# Altium footprint library 6-Connectors-1.PcbLib: 54 footprints (part 2 of 5)
Each footprint in its own frame and in the unit in brackets; x right, y up, seen from the top. Pads: shape width x height; smd on the part's side, far side on the other; paste and mask are expansions set on the pad; w line width, h text height; cw(c..) or ccw(c..) is an arc to the next point about the centre after c.
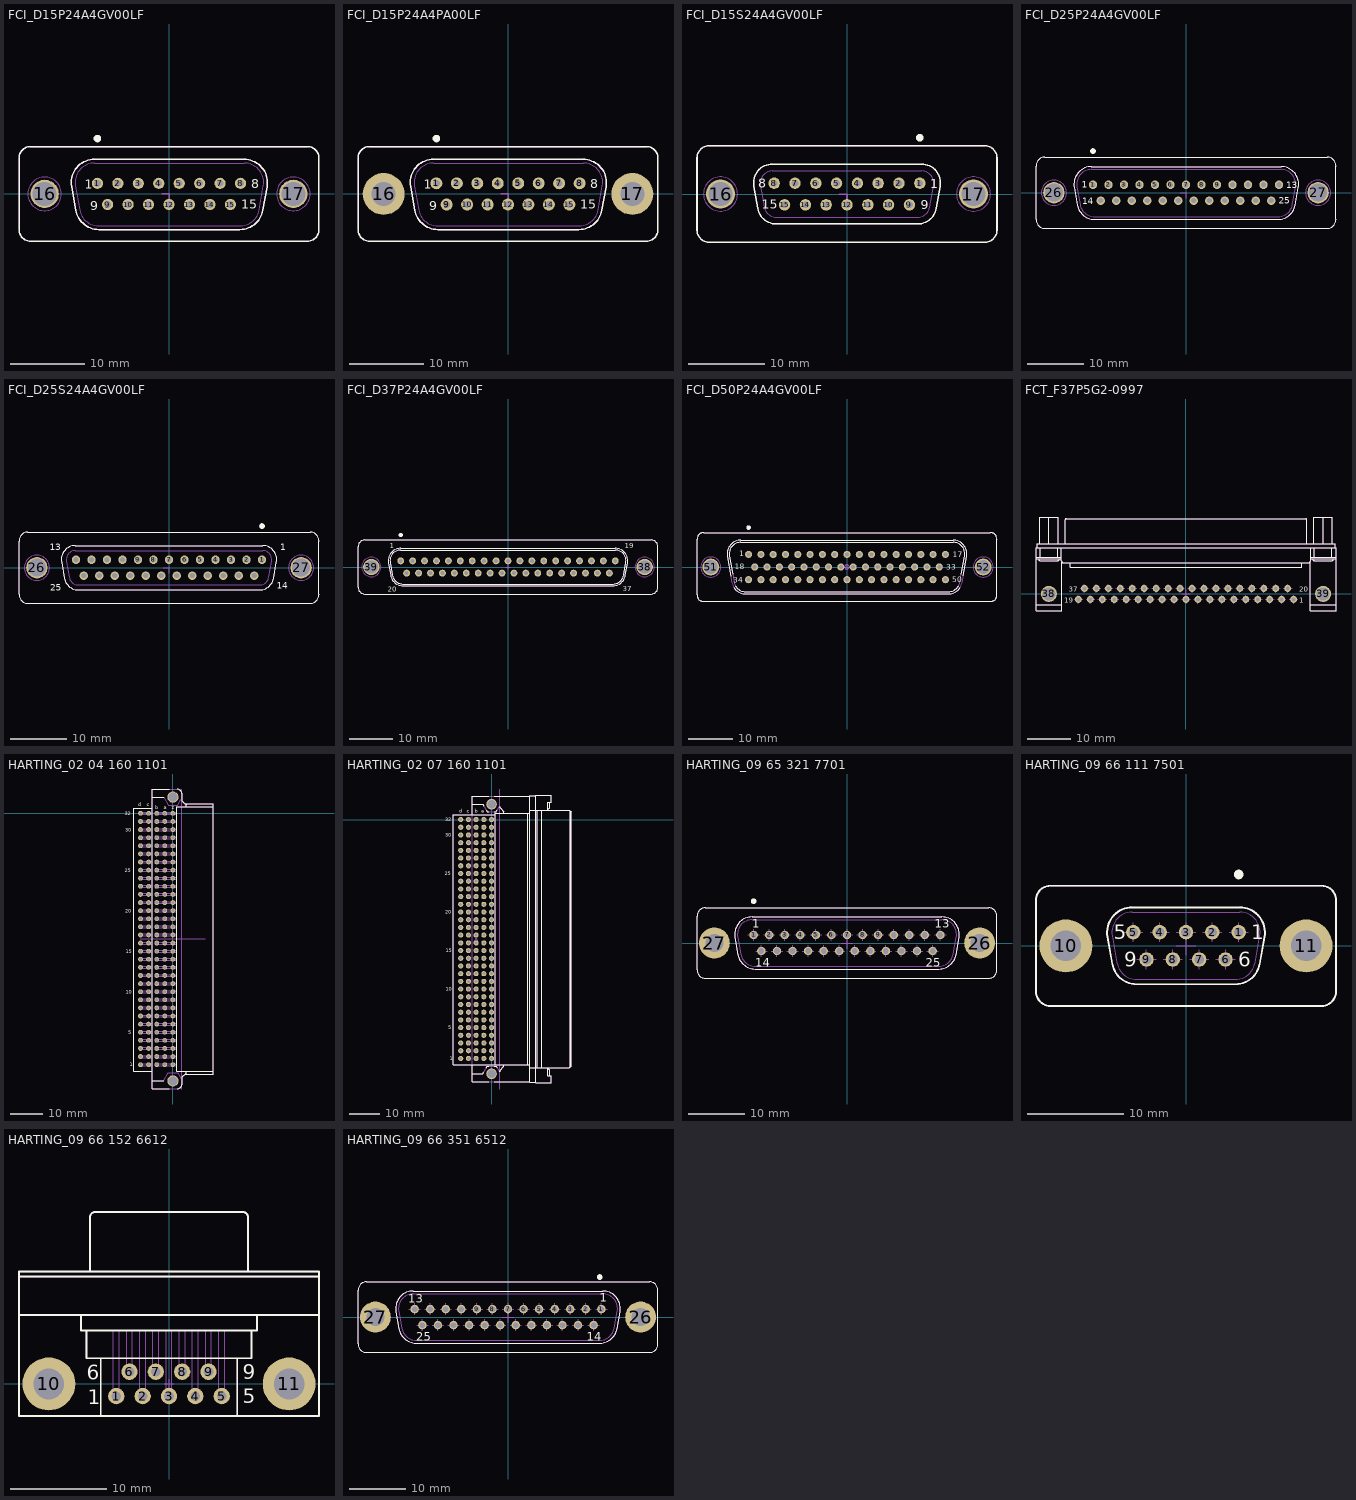
[diagram p1: the footprints below, top view; thin cyan lines are the x and y axes]

## FCI_D15P24A4GV00LF [mm] "Straight D-SUB 15 Male Contacts for PCB  with Harpoons and Female Screwlock (UNC4-40) and Elec. Continuity"
height 12.25
pads (17):
  round 1.5 hole 0.9: 1(-9.59,1.42) 2(-6.85,1.42) 3(-4.11,1.42) 4(-1.37,1.42) 5(1.37,1.42) 6(4.11,1.42) 7(6.85,1.42) 8(9.59,1.42) 9(-8.22,-1.42) 10(-5.48,-1.42) 11(-2.74,-1.42) 12(0,-1.42) 13(2.74,-1.42) 14(5.48,-1.42) 15(8.22,-1.42)
  round 3.8 hole 3.2: 16(-16.66,0) 17(16.66,0)
Top Overlay:
  circle w0.5: c-9.59,7.42 r0.25
  lines w0.2: -20.095,-4.75 ccw(c-18.495,-4.75) -18.495,-6.35 18.495,-6.35 ccw(c18.495,-4.75) 20.095,-4.75 20.095,4.75 ccw(c18.495,4.75) 18.495,6.35 -18.495,6.35 ccw(c-18.495,4.75) -20.095,4.75 -20.095,-4.75 ; -13.038,0.978 cw(c-9.965,1.52) -9.965,4.64 10.065,4.64 cw(c10.065,1.52) 13.138,0.978 12.579,-2.192 cw(c9.506,-1.65) 9.506,-4.77 -9.406,-4.77 cw(c-9.406,-1.65) -12.479,-2.192 -13.038,0.978
  text "15" at 9.695,-1.995 h1.2
  text "1" at -11.29,0.67 h1.2
  text "9" at -10.52,-2.17 h1.2
  text "8" at 11.04,0.77 h1.2
Mechanical 8:
  lines w0.2: -1,0 0,0 0,-1
Mechanical 14:
  circle w0.1: c16.66,0 r2.25
  circle w0.1: c-16.66,0 r2.25
  lines w0.1: -20.095,-4.75 ccw(c-18.495,-4.75) -18.495,-6.35 18.495,-6.35 ccw(c18.495,-4.75) 20.095,-4.75 20.095,4.75 ccw(c18.495,4.75) 18.495,6.35 -18.495,6.35 ccw(c-18.495,4.75) -20.095,4.75 -20.095,-4.75 ; -13.038,0.978 cw(c-9.965,1.52) -9.965,4.64 10.065,4.64 cw(c10.065,1.52) 13.138,0.978 12.579,-2.192 cw(c9.506,-1.65) 9.506,-4.77 -9.406,-4.77 cw(c-9.406,-1.65) -12.479,-2.192 -13.038,0.978 ; -12.545,1.065 cw(c-9.965,1.52) -9.965,4.14 10.065,4.14 cw(c10.065,1.52) 12.645,1.065 12.086,-2.105 cw(c9.506,-1.65) 9.506,-4.27 -9.406,-4.27 cw(c-9.406,-1.65) -11.986,-2.105 -12.545,1.065
  text "8" at 11.04,0.77 h1.2
  text "9" at -10.52,-2.17 h1.2
  text "1" at -11.29,0.67 h1.2
  text "15" at 9.695,-1.995 h1.2
  text "15 D-Sub Male" at -6.028,4.847 h1.2
3D body "FCI_D15P24A4GV00LF.stp": height 12, standoff -3, extent -19.66,-6.275 19.66,6.275

## FCI_D15P24A4PA00LF [mm] "Straight D-SUB 15 Male Contacts for PCB  without Harpoons and without Female Screwlock"
height 12.25
pads (17):
  round 1.6 hole 0.9: 1(-9.59,1.42) 2(-6.85,1.42) 3(-4.11,1.42) 4(-1.37,1.42) 5(1.37,1.42) 6(4.11,1.42) 7(6.85,1.42) 8(9.59,1.42) 9(-8.22,-1.42) 10(-5.48,-1.42) 11(-2.74,-1.42) 12(0,-1.42) 13(2.74,-1.42) 14(5.48,-1.42) 15(8.22,-1.42)
  round 5.6 hole 3.2: 16(-16.66,0) 17(16.66,0)
Top Overlay:
  circle w0.5: c-9.59,7.42 r0.25
  lines w0.2: -20.095,-4.75 ccw(c-18.495,-4.75) -18.495,-6.35 18.495,-6.35 ccw(c18.495,-4.75) 20.095,-4.75 20.095,4.75 ccw(c18.495,4.75) 18.495,6.35 -18.495,6.35 ccw(c-18.495,4.75) -20.095,4.75 -20.095,-4.75 ; -13.038,0.978 cw(c-9.965,1.52) -9.965,4.64 10.065,4.64 cw(c10.065,1.52) 13.138,0.978 12.579,-2.192 cw(c9.506,-1.65) 9.506,-4.77 -9.406,-4.77 cw(c-9.406,-1.65) -12.479,-2.192 -13.038,0.978
  text "8" at 11.04,0.77 h1.2
  text "9" at -10.52,-2.17 h1.2
  text "1" at -11.29,0.67 h1.2
  text "15" at 9.695,-1.995 h1.2
Mechanical 8:
  lines w0.2: -1,0 0,0 0,-1
Mechanical 14:
  circle w0.1: c-16.66,0 r2.25
  circle w0.1: c16.66,0 r2.25
  lines w0.1: -20.095,-4.75 ccw(c-18.495,-4.75) -18.495,-6.35 18.495,-6.35 ccw(c18.495,-4.75) 20.095,-4.75 20.095,4.75 ccw(c18.495,4.75) 18.495,6.35 -18.495,6.35 ccw(c-18.495,4.75) -20.095,4.75 -20.095,-4.75 ; -13.038,0.978 cw(c-9.965,1.52) -9.965,4.64 10.065,4.64 cw(c10.065,1.52) 13.138,0.978 12.579,-2.192 cw(c9.506,-1.65) 9.506,-4.77 -9.406,-4.77 cw(c-9.406,-1.65) -12.479,-2.192 -13.038,0.978 ; -12.545,1.065 cw(c-9.965,1.52) -9.965,4.14 10.065,4.14 cw(c10.065,1.52) 12.645,1.065 12.086,-2.105 cw(c9.506,-1.65) 9.506,-4.27 -9.406,-4.27 cw(c-9.406,-1.65) -11.986,-2.105 -12.545,1.065
  text "15 D-Sub Male" at -6.028,4.847 h1.2
  text "15" at 9.695,-1.995 h1.2
  text "1" at -11.29,0.67 h1.2
  text "9" at -10.52,-2.17 h1.2
  text "8" at 11.04,0.77 h1.2
3D body "FCI_D15P24A4PA00LF.stp": height 11.9, standoff -2, extent -19.66,-6.275 19.66,6.275

## FCI_D15S24A4GV00LF [mm] "Straight D-SUB 15 Female Contacts for PCB  with Harpoons and Female Screwlock (UNC4-40) and Elec. Continuity"
height 12.39
pads (17):
  round 1.5 hole 0.9: 1(9.59,1.42) 2(6.85,1.42) 3(4.11,1.42) 4(1.37,1.42) 5(-1.37,1.42) 6(-4.11,1.42) 7(-6.85,1.42) 8(-9.59,1.42) 9(8.22,-1.42) 10(5.48,-1.42) 11(2.74,-1.42) 12(0,-1.42) 13(-2.74,-1.42) 14(-5.48,-1.42) 15(-8.22,-1.42)
  round 3.8 hole 3.2: 16(-16.66,0) 17(16.66,0)
Top Overlay:
  circle w0.5: c9.59,7.42 r0.25
  lines w0.2: -19.76,-4.75 ccw(c-18.16,-4.75) -18.16,-6.35 18.16,-6.35 ccw(c18.16,-4.75) 19.76,-4.75 19.76,4.75 ccw(c18.16,4.75) 18.16,6.35 -18.16,6.35 ccw(c-18.16,4.75) -19.76,4.75 -19.76,-4.75 ; -12.277,1.011 cw(c-9.815,1.445) -9.815,3.945 9.815,3.945 cw(c9.815,1.445) 12.277,1.011 11.767,-1.879 cw(c9.305,-1.445) 9.305,-3.945 -9.305,-3.945 cw(c-9.305,-1.445) -11.767,-1.879 -12.277,1.011
  text "15" at -11.22,-1.945 h1.2
  text "8" at -11.69,0.82 h1.2
  text "1" at 10.965,0.77 h1.2
  text "9" at 9.695,-1.995 h1.2
Mechanical 8:
  lines w0.2: -1,0 0,0 0,-1
Mechanical 14:
  circle w0.1: c-16.66,0 r2.25
  circle w0.1: c16.66,0 r2.25
  lines w0.1: -19.76,-4.75 ccw(c-18.16,-4.75) -18.16,-6.35 18.16,-6.35 ccw(c18.16,-4.75) 19.76,-4.75 19.76,4.75 ccw(c18.16,4.75) 18.16,6.35 -18.16,6.35 ccw(c-18.16,4.75) -19.76,4.75 -19.76,-4.75 ; -12.277,1.011 cw(c-9.815,1.445) -9.815,3.945 9.815,3.945 cw(c9.815,1.445) 12.277,1.011 11.767,-1.879 cw(c9.305,-1.445) 9.305,-3.945 -9.305,-3.945 cw(c-9.305,-1.445) -11.767,-1.879 -12.277,1.011 ; -11.401,1.167 cw(c-9.825,1.445) -9.825,3.045 9.825,3.045 cw(c9.825,1.445) 11.401,1.167 10.891,-1.723 cw(c9.315,-1.445) 9.315,-3.045 -9.315,-3.045 cw(c-9.315,-1.445) -10.891,-1.723 -11.401,1.167
  text "15 D-Sub Female" at -6.278,4.522 h1.2
  text "9" at 12.845,-2.07 h1.2
  text "1" at 12.99,1.095 h1.2
  text "8" at -13.715,0.945 h1.2
  text "15" at -14.17,-2.045 h1.2
3D body "FCI_D15S24A4GV00LF.stp": height 12.1, standoff -3, extent -19.66,-6.275 19.66,6.275

## FCI_D25P24A4GV00LF [mm] "Straight D-SUB 25 Male Contacts for PCB  with Harpoons and Female Screwlock (UNC4-40) and Elec. Continuity"
height 12.05
pads (27):
  round 1.5 hole 0.9: 1(-16.56,1.42) 2(-13.8,1.42) 3(-11.04,1.42) 4(-8.28,1.42) 5(-5.52,1.42) 6(-2.76,1.42) 7(0,1.42) 8(2.76,1.42) 9(5.52,1.42) 10(8.28,1.42) 11(11.04,1.42) 12(13.8,1.42) 13(16.56,1.42) 14(-15.18,-1.42) 15(-12.42,-1.42) 16(-9.66,-1.42) 17(-6.9,-1.42) 18(-4.14,-1.42) 19(-1.38,-1.42) 20(1.38,-1.42) 21(4.14,-1.42) 22(6.9,-1.42) 23(9.66,-1.42) 24(12.42,-1.42) 25(15.18,-1.42)
  round 3.8 hole 3.2: 26(-23.52,0) 27(23.52,0)
Top Overlay:
  circle w0.5: c-16.56,7.42 r0.25
  lines w0.2: -26.705,-4.75 ccw(c-25.105,-4.75) -25.105,-6.35 25.105,-6.35 ccw(c25.105,-4.75) 26.705,-4.75 26.705,4.75 ccw(c25.105,4.75) 25.105,6.35 -25.105,6.35 ccw(c-25.105,4.75) -26.705,4.75 -26.705,-4.75 ; -19.903,0.978 cw(c-16.83,1.52) -16.83,4.64 16.93,4.64 cw(c16.93,1.52) 20.003,0.978 19.444,-2.192 cw(c16.371,-1.65) 16.371,-4.77 -16.271,-4.77 cw(c-16.271,-1.65) -19.344,-2.192 -19.903,0.978
  text "25" at 16.55,-1.925 h1.2
  text "1" at -18.575,0.85 h1.2
  text "13" at 17.825,0.825 h1.2
  text "14" at -18.475,-2.05 h1.2
Mechanical 8:
  lines w0.2: -1,0 0,0 0,-1
Mechanical 14:
  circle w0.1: c23.52,0 r2.25
  circle w0.1: c-23.52,0 r2.25
  lines w0.1: -26.705,-4.75 ccw(c-25.105,-4.75) -25.105,-6.35 25.105,-6.35 ccw(c25.105,-4.75) 26.705,-4.75 26.705,4.75 ccw(c25.105,4.75) 25.105,6.35 -25.105,6.35 ccw(c-25.105,4.75) -26.705,4.75 -26.705,-4.75 ; -19.903,0.978 cw(c-16.83,1.52) -16.83,4.64 16.93,4.64 cw(c16.93,1.52) 20.003,0.978 19.444,-2.192 cw(c16.371,-1.65) 16.371,-4.77 -16.271,-4.77 cw(c-16.271,-1.65) -19.344,-2.192 -19.903,0.978 ; -19.41,1.065 cw(c-16.83,1.52) -16.83,4.14 16.93,4.14 cw(c16.93,1.52) 19.51,1.065 18.951,-2.105 cw(c16.371,-1.65) 16.371,-4.27 -16.271,-4.27 cw(c-16.271,-1.65) -18.851,-2.105 -19.41,1.065
  text "25 D-Sub Male" at -6.478,4.872 h1.2
  text "14" at -18.475,-2.05 h1.2
  text "13" at 17.5,0.875 h1.2
  text "1" at -18.575,0.85 h1.2
  text "25" at 16.55,-1.925 h1.2
3D body "FCI_D25P24A4GV00LF.stp": height 12, standoff -3, extent -26.52,-6.275 26.52,6.275

## FCI_D25S24A4GV00LF [mm] "Straight D-SUB 25 Female Contacts for PCB  with Harpoons and Female Screwlock (UNC4-40) and Elec. Continuity"
height 12.39
pads (27):
  round 1.5 hole 0.9: 1(16.56,1.42) 2(13.8,1.42) 3(11.04,1.42) 4(8.28,1.42) 5(5.52,1.42) 6(2.76,1.42) 7(0,1.42) 8(-2.76,1.42) 9(-5.52,1.42) 10(-8.28,1.42) 11(-11.04,1.42) 12(-13.8,1.42) 13(-16.56,1.42) 14(15.18,-1.42) 15(12.42,-1.42) 16(9.66,-1.42) 17(6.9,-1.42) 18(4.14,-1.42) 19(1.38,-1.42) 20(-1.38,-1.42) 21(-4.14,-1.42) 22(-6.9,-1.42) 23(-9.66,-1.42) 24(-12.42,-1.42) 25(-15.18,-1.42)
  round 3.8 hole 3.2: 26(-23.52,0) 27(23.52,0)
Top Overlay:
  circle w0.5: c16.56,7.42 r0.25
  lines w0.2: -26.705,-4.75 ccw(c-25.105,-4.75) -25.105,-6.35 25.105,-6.35 ccw(c25.105,-4.75) 26.705,-4.75 26.705,4.75 ccw(c25.105,4.75) 25.105,6.35 -25.105,6.35 ccw(c-25.105,4.75) -26.705,4.75 -26.705,-4.75 ; -19.137,1.011 cw(c-16.675,1.445) -16.675,3.945 16.675,3.945 cw(c16.675,1.445) 19.137,1.011 18.627,-1.879 cw(c16.165,-1.445) 16.165,-3.945 -16.165,-3.945 cw(c-16.165,-1.445) -18.627,-1.879 -19.137,1.011
  text "25" at -21.1,-4.1 h1.2
  text "14" at 19.2,-3.75 h1.2
  text "1" at 19.775,3.1 h1.2
  text "13" at -21.225,3.125 h1.2
Mechanical 8:
  lines w0.2: -1,0 0,0 0,-1
Mechanical 14:
  circle w0.1: c23.52,0 r2.25
  circle w0.1: c-23.52,0 r2.25
  lines w0.1: -26.705,-4.75 ccw(c-25.105,-4.75) -25.105,-6.35 25.105,-6.35 ccw(c25.105,-4.75) 26.705,-4.75 26.705,4.75 ccw(c25.105,4.75) 25.105,6.35 -25.105,6.35 ccw(c-25.105,4.75) -26.705,4.75 -26.705,-4.75 ; -19.137,1.011 cw(c-16.675,1.445) -16.675,3.945 16.675,3.945 cw(c16.675,1.445) 19.137,1.011 18.627,-1.879 cw(c16.165,-1.445) 16.165,-3.945 -16.165,-3.945 cw(c-16.165,-1.445) -18.627,-1.879 -19.137,1.011 ; -18.261,1.167 cw(c-16.685,1.445) -16.685,3.045 16.685,3.045 cw(c16.685,1.445) 18.261,1.167 17.751,-1.723 cw(c16.175,-1.445) 16.175,-3.045 -16.175,-3.045 cw(c-16.175,-1.445) -17.751,-1.723 -18.261,1.167
  text "13" at -21.225,3.125 h1.2
  text "1" at 19.775,3.1 h1.2
  text "14" at 19.2,-3.75 h1.2
  text "25" at -21.1,-4.1 h1.2
  text "25 D-Sub Female" at -6.328,4.497 h1.2
3D body "FCI_D25S24A4GV00LF.stp": height 12.1, standoff -3, extent -26.52,-6.275 26.52,6.275

## FCI_D37P24A4GV00LF [mm] "Straight D-SUB 37 Male Contacts for PCB  with Harpoons and Female Screwlock (UNC4-40) and Elec. Continuity"
height 12.05
pads (39):
  round 1.6 hole 0.9: 1(-24.93,1.42) 2(-22.16,1.42) 3(-19.39,1.42) 4(-16.62,1.42) 5(-13.85,1.42) 6(-11.08,1.42) 7(-8.31,1.42) 8(-5.54,1.42) 9(-2.77,1.42) 10(0,1.42) 11(2.77,1.42) 12(5.54,1.42) 13(8.31,1.42) 14(11.08,1.42) 15(13.85,1.42) 16(16.62,1.42) 17(19.39,1.42) 18(22.16,1.42) 19(24.93,1.42) 20(-23.545,-1.42) 21(-20.775,-1.42) 22(-18.005,-1.42) 23(-15.235,-1.42) 24(-12.465,-1.42) 25(-9.695,-1.42) 26(-6.925,-1.42) 27(-4.155,-1.42) 28(-1.385,-1.42) 29(1.385,-1.42) 30(4.155,-1.42) 31(6.925,-1.42) 32(9.695,-1.42) 33(12.465,-1.42) 34(15.235,-1.42) 35(18.005,-1.42) 36(20.775,-1.42) 37(23.545,-1.42)
  round 3.8 hole 3.1: 38(31.75,0) 39(-31.75,0)
Top Overlay:
  circle w0.5: c-24.93,7.42 r0.25
  lines w0.2: -34.85,-4.675 ccw(c-33.25,-4.675) -33.25,-6.275 33.25,-6.275 ccw(c33.25,-4.675) 34.85,-4.675 34.85,4.675 ccw(c33.25,4.675) 33.25,6.275 -33.25,6.275 ccw(c-33.25,4.675) -34.85,4.675 -34.85,-4.675 ; -27.776,0.946 cw(c-24.92,1.45) -24.92,4.35 24.92,4.35 cw(c24.92,1.45) 27.776,0.946 27.265,-1.954 cw(c24.409,-1.45) 24.409,-4.35 -24.409,-4.35 cw(c-24.409,-1.45) -27.265,-1.954 -27.776,0.946 ; -27.382,1.016 cw(c-24.92,1.45) -24.92,3.95 24.92,3.95 cw(c24.92,1.45) 27.382,1.016 26.871,-1.884 cw(c24.409,-1.45) 24.409,-3.95 -24.409,-3.95 cw(c-24.409,-1.45) -26.871,-1.884 -27.382,1.016
  text "37" at 26.609,-5.64 h1.2
  text "19" at 27.093,4.393 h1.2
  text "1" at -27.475,4.393 h1.2
  text "20" at -27.97,-5.692 h1.2
Mechanical 8:
  drawing of 160 lines, arcs and shapes, not listed
Mechanical 14:
  circle w0.1: c31.75,0 r2.25
  circle w0.1: c-31.75,0 r2.25
  lines w0.1: -34.85,-4.675 ccw(c-33.25,-4.675) -33.25,-6.275 33.25,-6.275 ccw(c33.25,-4.675) 34.85,-4.675 34.85,4.675 ccw(c33.25,4.675) 33.25,6.275 -33.25,6.275 ccw(c-33.25,4.675) -34.85,4.675 -34.85,-4.675 ; -27.776,0.946 cw(c-24.92,1.45) -24.92,4.35 24.92,4.35 cw(c24.92,1.45) 27.776,0.946 27.265,-1.954 cw(c24.409,-1.45) 24.409,-4.35 -24.409,-4.35 cw(c-24.409,-1.45) -27.265,-1.954 -27.776,0.946 ; -27.382,1.016 cw(c-24.92,1.45) -24.92,3.95 24.92,3.95 cw(c24.92,1.45) 27.382,1.016 26.871,-1.884 cw(c24.409,-1.45) 24.409,-3.95 -24.409,-3.95 cw(c-24.409,-1.45) -26.871,-1.884 -27.382,1.016
  text "37 D-Sub Male" at -8.078,4.697 h1.2
  text "20" at -27.97,-5.692 h1.2
  text "1" at -27.475,4.393 h1.2
  text "19" at 27.093,4.393 h1.2
  text "37" at 26.609,-5.64 h1.2
3D body "FCI_D37P24A4GV00LF.stp": height 12, standoff -3.2, extent -34.85,-6.275 34.85,6.275

## FCI_D50P24A4GV00LF [mm] "Straight D-SUB 50 Male Contacts for PCB  with Harpoons and Female Screwlock (UNC4-40) and Elec. Continuity"
height 12.3
pads (52):
  round 1.6 hole 0.9: 1(-22.08,2.84) 2(-19.32,2.84) 3(-16.56,2.84) 4(-13.8,2.84) 5(-11.04,2.84) 6(-8.28,2.84) 7(-5.52,2.84) 8(-2.76,2.84) 9(0,2.84) 10(2.76,2.84) 11(5.52,2.84) 12(8.28,2.84) 13(11.04,2.84) 14(13.8,2.84) 15(16.56,2.84) 16(19.32,2.84) 17(22.08,2.84) 18(-20.7,0) 19(-17.94,0) 20(-15.18,0) 21(-12.42,0) 22(-9.66,0) 23(-6.9,0) 24(-4.14,0) 25(-1.38,0) 26(1.38,0) 27(4.14,0) 28(6.9,0) 29(9.66,0) 30(12.42,0) 31(15.18,0) 32(17.94,0) 33(20.7,0) 34(-22.08,-2.84) 35(-19.32,-2.84) 36(-16.56,-2.84) 37(-13.8,-2.84) 38(-11.04,-2.84) 39(-8.28,-2.84) 40(-5.52,-2.84) 41(-2.76,-2.84) 42(0,-2.84) 43(2.76,-2.84) 44(5.52,-2.84) 45(8.28,-2.84) 46(11.04,-2.84) 47(13.8,-2.84) 48(16.56,-2.84) 49(19.32,-2.84) 50(22.08,-2.84)
  round 3.8 hole 3.1: 51(-30.55,0) 52(30.55,0)
Top Overlay:
  circle w0.5: c-22.08,8.84 r0.25
  lines w0.2: -26.063,-2.11 -26.858,2.397 cw(c-23.805,2.935) -23.805,6.035 23.805,6.035 cw(c23.805,2.935) 26.858,2.397 26.082,-2.004 ; -25.647,-1.592 -26.366,2.484 cw(c-23.805,2.935) -23.805,5.535 23.805,5.535 cw(c23.805,2.935) 26.366,2.484 25.65,-1.575 ; -25.455,-4.485 ccw(c-22.77,-2.935) -22.77,-6.035 22.77,-6.035 ccw(c22.77,-2.935) 25.455,-4.485 ; -25.022,-4.235 ccw(c-22.77,-2.935) -22.77,-5.535 22.77,-5.535 ccw(c22.77,-2.935) 25.022,-4.235 ; -33.655,-6.23 ccw(c-32.155,-6.23) -32.155,-7.73 32.155,-7.73 ccw(c32.155,-6.23) 33.655,-6.23 33.655,6.23 ccw(c32.155,6.23) 32.155,7.73 -32.155,7.73 ccw(c-32.155,6.23) -33.655,6.23 -33.655,-6.23
  text "17" at 23.685,2.25 h1.2
  text "1" at -24.225,2.4 h1.2
  text "33" at 22.275,-0.575 h1.2
  text "50" at 23.6,-3.45 h1.2
  text "34" at -25.515,-3.56 h1.2
  text "18" at -25.15,-0.55 h1.2
Mechanical 8:
  drawing of 213 lines, arcs and shapes, not listed
Mechanical 14:
  circle w0.1: c30.55,0 r2.25
  circle w0.1: c-30.55,0 r2.25
  lines w0.1: -33.655,-6.23 ccw(c-32.155,-6.23) -32.155,-7.73 32.155,-7.73 ccw(c32.155,-6.23) 33.655,-6.23 33.655,6.23 ccw(c32.155,6.23) 32.155,7.73 -32.155,7.73 ccw(c-32.155,6.23) -33.655,6.23 -33.655,-6.23 ; -26.858,2.397 cw(c-23.805,2.935) -23.805,6.035 23.805,6.035 cw(c23.805,2.935) 26.858,2.397 25.823,-3.473 cw(c22.77,-2.935) 22.77,-6.035 -22.77,-6.035 cw(c-22.77,-2.935) -25.823,-3.473 -26.858,2.397 ; -26.366,2.484 cw(c-23.805,2.935) -23.805,5.535 23.805,5.535 cw(c23.805,2.935) 26.366,2.484 25.33,-3.386 cw(c22.77,-2.935) 22.77,-5.535 -22.77,-5.535 cw(c-22.77,-2.935) -25.33,-3.386 -26.366,2.484
  text "17" at 23.685,2.25 h1.2
  text "50 D-Sub Male" at -8.053,6.247 h1.2
  text "18" at -25.15,-0.55 h1.2
  text "34" at -25.515,-3.56 h1.2
  text "50" at 23.6,-3.45 h1.2
  text "33" at 22.275,-0.575 h1.2
  text "1" at -24.225,2.4 h1.2
3D body "FCI_D50P24A4GV00LF.stp": height 12, standoff -3.2, extent -33.655,-7.73 33.655,7.73

## FCT_F37P5G2-0997 [mm] "Right Angled D-SUB 37 Male Contacts for PCB  with Harpoons and Female Screwlock (UNC4-40) and Elec. Continuity"
height 13.4
pads (39):
  round 1.6 hole 0.9: 1(24.93,-1.27) 2(22.16,-1.27) 3(19.39,-1.27) 4(16.62,-1.27) 5(13.85,-1.27) 6(11.08,-1.27) 7(8.31,-1.27) 8(5.54,-1.27) 9(2.77,-1.27) 10(0,-1.27) 11(-2.77,-1.27) 12(-5.54,-1.27) 13(-8.31,-1.27) 14(-11.08,-1.27) 15(-13.85,-1.27) 16(-16.62,-1.27) 17(-19.39,-1.27) 18(-22.16,-1.27) 19(-24.93,-1.27) 20(23.56,1.27) 21(20.79,1.27) 22(18.02,1.27) 23(15.25,1.27) 24(12.48,1.27) 25(9.71,1.27) 26(6.94,1.27) 27(4.17,1.27) 28(1.4,1.27) 29(-1.37,1.27) 30(-4.14,1.27) 31(-6.91,1.27) 32(-9.68,1.27) 33(-12.45,1.27) 34(-15.22,1.27) 35(-17.99,1.27) 36(-20.76,1.27) 37(-23.53,1.27)
  round 3.7 hole 3: 38(-31.75,0) 39(31.75,0)
Top Overlay:
  lines w0.2: -34.75,-2.5 -28.75,-2.5 ; -34.75,8.1 -28.85,8.1 ; -34.75,8.5 -28.85,8.5 ; -34.6,10.67 -34.6,11.57 34.6,11.57 34.6,10.67 ; -34.15,8.1 ccw(c-33.75,8.1) -33.75,7.7 -29.75,7.7 ccw(c-29.75,8.1) -29.35,8.1 ; -33.915,11.57 -33.915,17.77 -29.585,17.77 -29.585,11.57 ; -33.754,8.5 -33.754,10.67 ; -31.75,11.6 -31.75,17.77 ; -29.75,8.5 -29.75,10.67 ; -28.85,10.67 -28.85,7.67 ccw(c-28.35,7.67) -28.35,7.17 ; -28.75,7.37 -28.75,-3.9 -34.75,-3.9 -34.75,10.67 ; -28.65,7.17 28.35,7.17 ccw(c28.35,7.67) 28.85,7.67 28.85,10.67 ; -28.001,11.57 -28.001,17.17 cw(c-27.701,17.17) -27.701,17.47 27.702,17.47 cw(c27.702,17.17) 28.002,17.17 28.002,11.57 ; -26.819,7.17 -26.819,6.17 26.82,6.17 26.82,7.17 ; 28.75,-2.5 34.75,-2.5 ; 28.75,7.37 28.75,-3.9 34.75,-3.9 34.75,10.67 ; 28.85,8.1 34.75,8.1 ; 28.85,8.5 34.75,8.5 ; 29.35,8.1 ccw(c29.75,8.1) 29.75,7.7 33.75,7.7 ccw(c33.75,8.1) 34.15,8.1 ; 29.585,11.57 29.585,17.77 33.915,17.77 33.915,11.57 ; 29.75,8.5 29.75,10.67 ; 31.75,11.6 31.75,17.77 ; 33.754,8.5 33.754,10.67 ; -34.75,10.67 34.75,10.67 ; -34.75,10.67 34.75,10.67
  text "37" at -27.197,0.508 h1.2
  text "19" at -28.21,-2 h1.2
  text "1" at 26.181,-2.032 h1.2
  text "20" at 26.181,0.508 h1.2
Mechanical 8:
  drawing of 164 lines, arcs and shapes, not listed
Mechanical 14:
  circle w0.1: c31.75,0 r1.55
  circle w0.1: c-31.75,0 r1.55
  lines w0.1: -34.75,-2.5 -28.75,-2.5 ; -34.75,8.1 -28.85,8.1 ; -34.75,8.5 -28.85,8.5 ; -34.6,10.67 -34.6,11.57 34.6,11.57 34.6,10.67 ; -34.15,8.1 ccw(c-33.75,8.1) -33.75,7.7 -29.75,7.7 ccw(c-29.75,8.1) -29.35,8.1 ; -33.915,11.57 -33.915,17.77 -29.585,17.77 -29.585,11.57 ; -33.754,8.5 -33.754,10.67 ; -31.75,11.6 -31.75,17.77 ; -29.75,8.5 -29.75,10.67 ; -28.85,10.67 -28.85,7.67 ccw(c-28.35,7.67) -28.35,7.17 ; -28.75,7.37 -28.75,-3.9 -34.75,-3.9 -34.75,10.67 ; -28.65,7.17 28.35,7.17 ccw(c28.35,7.67) 28.85,7.67 28.85,10.67 ; -28.001,11.57 -28.001,17.17 cw(c-27.701,17.17) -27.701,17.47 27.702,17.47 cw(c27.702,17.17) 28.002,17.17 28.002,11.57 ; -26.819,7.17 -26.819,6.17 26.82,6.17 26.82,7.17 ; 28.75,-2.5 34.75,-2.5 ; 28.75,7.37 28.75,-3.9 34.75,-3.9 34.75,10.67 ; 28.85,8.1 34.75,8.1 ; 28.85,8.5 34.75,8.5 ; 29.35,8.1 ccw(c29.75,8.1) 29.75,7.7 33.75,7.7 ccw(c33.75,8.1) 34.15,8.1 ; 29.585,11.57 29.585,17.77 33.915,17.77 33.915,11.57 ; 29.75,8.5 29.75,10.67 ; 31.75,11.6 31.75,17.77 ; 33.754,8.5 33.754,10.67 ; -34.75,10.67 34.75,10.67 ; -34.75,10.67 34.75,10.67
3D body "v160-080.stp": height 0.02, standoff -1.65, extent 24.13,-2.07 25.73,-0.47
3D body "v160-080.stp": height 0.02, standoff -1.65, extent 22.76,0.47 24.36,2.07
3D body "v160-080.stp": height 0.02, standoff -1.65, extent 19.99,0.47 21.59,2.07
3D body "v160-080.stp": height 0.02, standoff -1.65, extent 21.36,-2.07 22.96,-0.47
3D body "v160-080.stp": height 0.02, standoff -1.65, extent 18.59,-2.07 20.19,-0.47
3D body "v160-080.stp": height 0.02, standoff -1.65, extent 17.22,0.47 18.82,2.07
3D body "v160-080.stp": height 0.02, standoff -1.65, extent 15.82,-2.07 17.42,-0.47
3D body "v160-080.stp": height 0.02, standoff -1.65, extent 13.05,-2.07 14.65,-0.47
3D body "v160-080.stp": height 0.02, standoff -1.65, extent 14.45,0.47 16.05,2.07
3D body "v160-080.stp": height 0.02, standoff -1.65, extent 11.68,0.47 13.28,2.07
3D body "v160-080.stp": height 0.02, standoff -1.65, extent 10.28,-2.07 11.88,-0.47
3D body "v160-080.stp": height 0.02, standoff -1.65, extent 8.91,0.47 10.51,2.07
3D body "v160-080.stp": height 0.02, standoff -1.65, extent 7.51,-2.07 9.11,-0.47
3D body "v160-080.stp": height 0.02, standoff -1.65, extent 6.14,0.47 7.74,2.07
3D body "v160-080.stp": height 0.02, standoff -1.65, extent 4.74,-2.07 6.34,-0.47
3D body "v160-080.stp": height 0.02, standoff -1.65, extent 3.37,0.47 4.97,2.07
3D body "v160-080.stp": height 0.02, standoff -1.65, extent 1.97,-2.07 3.57,-0.47
3D body "v160-080.stp": height 0.02, standoff -1.65, extent 0.6,0.47 2.2,2.07
3D body "v160-080.stp": height 0.02, standoff -1.65, extent -0.8,-2.07 0.8,-0.47
3D body "v160-080.stp": height 0.02, standoff -1.65, extent -2.17,0.47 -0.57,2.07
3D body "v160-080.stp": height 0.02, standoff -1.65, extent -3.57,-2.07 -1.97,-0.47
3D body "v160-080.stp": height 0.02, standoff -1.65, extent -4.94,0.47 -3.34,2.07
3D body "v160-080.stp": height 0.02, standoff -1.65, extent -6.34,-2.07 -4.74,-0.47
3D body "v160-080.stp": height 0.02, standoff -1.65, extent -7.71,0.47 -6.11,2.07
3D body "v160-080.stp": height 0.02, standoff -1.65, extent -9.11,-2.07 -7.51,-0.47
3D body "v160-080.stp": height 0.02, standoff -1.65, extent -10.48,0.47 -8.88,2.07
3D body "v160-080.stp": height 0.02, standoff -1.65, extent -11.88,-2.07 -10.28,-0.47
3D body "v160-080.stp": height 0.02, standoff -1.65, extent -13.25,0.47 -11.65,2.07
3D body "v160-080.stp": height 0.02, standoff -1.65, extent -14.65,-2.07 -13.05,-0.47
3D body "v160-080.stp": height 0.02, standoff -1.65, extent -16.02,0.47 -14.42,2.07
3D body "v160-080.stp": height 0.02, standoff -1.65, extent -17.42,-2.07 -15.82,-0.47
3D body "v160-080.stp": height 0.02, standoff -1.65, extent -18.79,0.47 -17.19,2.07
3D body "v160-080.stp": height 0.02, standoff -1.65, extent -20.19,-2.07 -18.59,-0.47
3D body "v160-080.stp": height 0.02, standoff -1.65, extent -21.56,0.47 -19.96,2.07
3D body "v160-080.stp": height 0.02, standoff -1.65, extent -22.96,-2.07 -21.36,-0.47
3D body "v160-080.stp": height 0.02, standoff -1.65, extent -25.73,-2.07 -24.13,-0.47
3D body "v160-080.stp": height 0.02, standoff -1.65, extent -24.33,0.47 -22.73,2.07
3D body "FCT_37P5G2-0997.stp": height 13.45, standoff -4.2, extent -34.75,-3.9 34.75,17.77
